# Altium integrated library mobinbyn_Connector.IntLib: 67 symbols
Pins are listed as number, name and electrical type; pins without a type are passive.

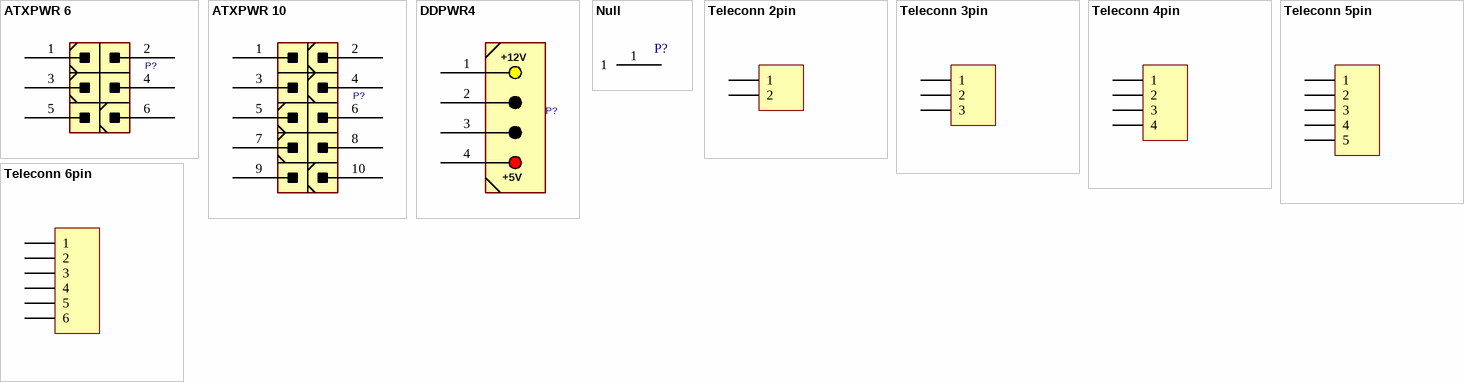
[diagram p0: symbols ATXPWR 6 to Teleconn 6pin]

## ATXPWR 6
designator P?
CONN, ATX POWER, 6 P; DatasheetVersion: 2022
footprint ATX_PWR6R (PCI Express POWER CONNECTOR 6PIN 12V Right Angle)
footprint ATX_PWR6 (Connector; ATX Power; 6 Position)
pins: 1, 2, 3, 4, 5, 6

## ATXPWR 10
designator P?
CONN, ATX POWER, 10 P; DatasheetVersion: 2022
footprint ATX_PWR10 (Connector; ATX Power; 10 Position, TE 4-1775099-3)
pins: 1, 2, 3, 4, 5, 6, 7, 8, 9, 10

## DDPWR4
designator P?
CONN, DP04PR IDE DISK DRIVE 4pin; DatasheetVersion: 2022
footprint DDPWR4_S (DP04PR IDE DISK DRIVE 4pin power connector Straight Power Plug)
footprint DDPWR4_R (DP04PR IDE DISK DRIVE 4pin power connector Right Angle Power Plug)
pins: 1, 2, 3, 4
text: +12V; +5V

## Null
designator P?
DatasheetVersion: 2022
footprint Socket
pins: 1

## Teleconn 2pin
designator P?
Telecommunications; DatasheetVersion: 2022
footprint Teleconn_2pin
pins: 1, 2

## Teleconn 3pin
designator P?
Telecommunications; DatasheetVersion: 2022
footprint Teleconn_3pin
pins: 1, 2, 3

## Teleconn 4pin
designator P?
Telecommunications; DatasheetVersion: 2022
footprint Teleconn_4pin
pins: 1, 2, 3, 4

## Teleconn 5pin
designator P?
Telecommunications; DatasheetVersion: 2022
footprint Teleconn_5pin
pins: 1, 2, 3, 4, 5

## Teleconn 6pin
designator P?
Telecommunications; DatasheetVersion: 2022
footprint Teleconn_6pin
pins: 1, 2, 3, 4, 5, 6


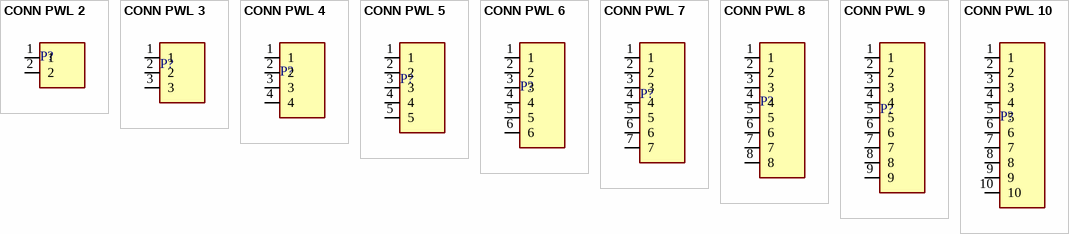
[diagram p1: symbols CONN PWL 2 to CONN PWL 10]

## CONN PWL 2
designator P?
Power Terminal 2pin,Header, 2-Pin; DatasheetVersion: 2022
footprint PWL_2 (Connector; Header; 2 Position)
pins: 1, 2

## CONN PWL 3
designator P?
Power Terminal 3pin,Header, 3-Pin; DatasheetVersion: 2022
footprint PWL_3 (Connector; Header; 3 Position)
pins: 1, 2, 3

## CONN PWL 4
designator P?
Power Terminal 4pin,Header, 4-Pin; DatasheetVersion: 2022
footprint PWL_4 (Connector; Header; 4 Position)
pins: 1, 2, 3, 4

## CONN PWL 5
designator P?
Power Terminal 5pin,Header, 5-Pin; DatasheetVersion: 2022
footprint PWL_5 (Connector; Header; 5 Position)
pins: 1, 2, 3, 4, 5

## CONN PWL 6
designator P?
Power Terminal 6pin,Header, 6-Pin; DatasheetVersion: 2022
footprint PWL_6 (Connector; Header; 6 Position)
pins: 1, 2, 3, 4, 5, 6

## CONN PWL 7
designator P?
Power Terminal 7pin,Header, 7-Pin; DatasheetVersion: 2022
footprint PWL_7 (Connector; Header; 7 Position)
pins: 1, 2, 3, 4, 5, 6, 7

## CONN PWL 8
designator P?
Power Terminal 8pin,Header, 8-Pin; DatasheetVersion: 2022
footprint PWL_8 (Connector; Header; 8 Position)
pins: 1, 2, 3, 4, 5, 6, 7, 8

## CONN PWL 9
designator P?
Power Terminal 9pin,Header, 9-Pin; DatasheetVersion: 2022
footprint PWL_9 (Connector; Header; 9 Position)
pins: 1, 2, 3, 4, 5, 6, 7, 8, 9

## CONN PWL 10
designator P?
Power Terminal 10pin,Header, 10-Pin; DatasheetVersion: 2022
footprint PWL_10 (Connector; Header; 10 Position)
pins: 1, 2, 3, 4, 5, 6, 7, 8, 9, 10


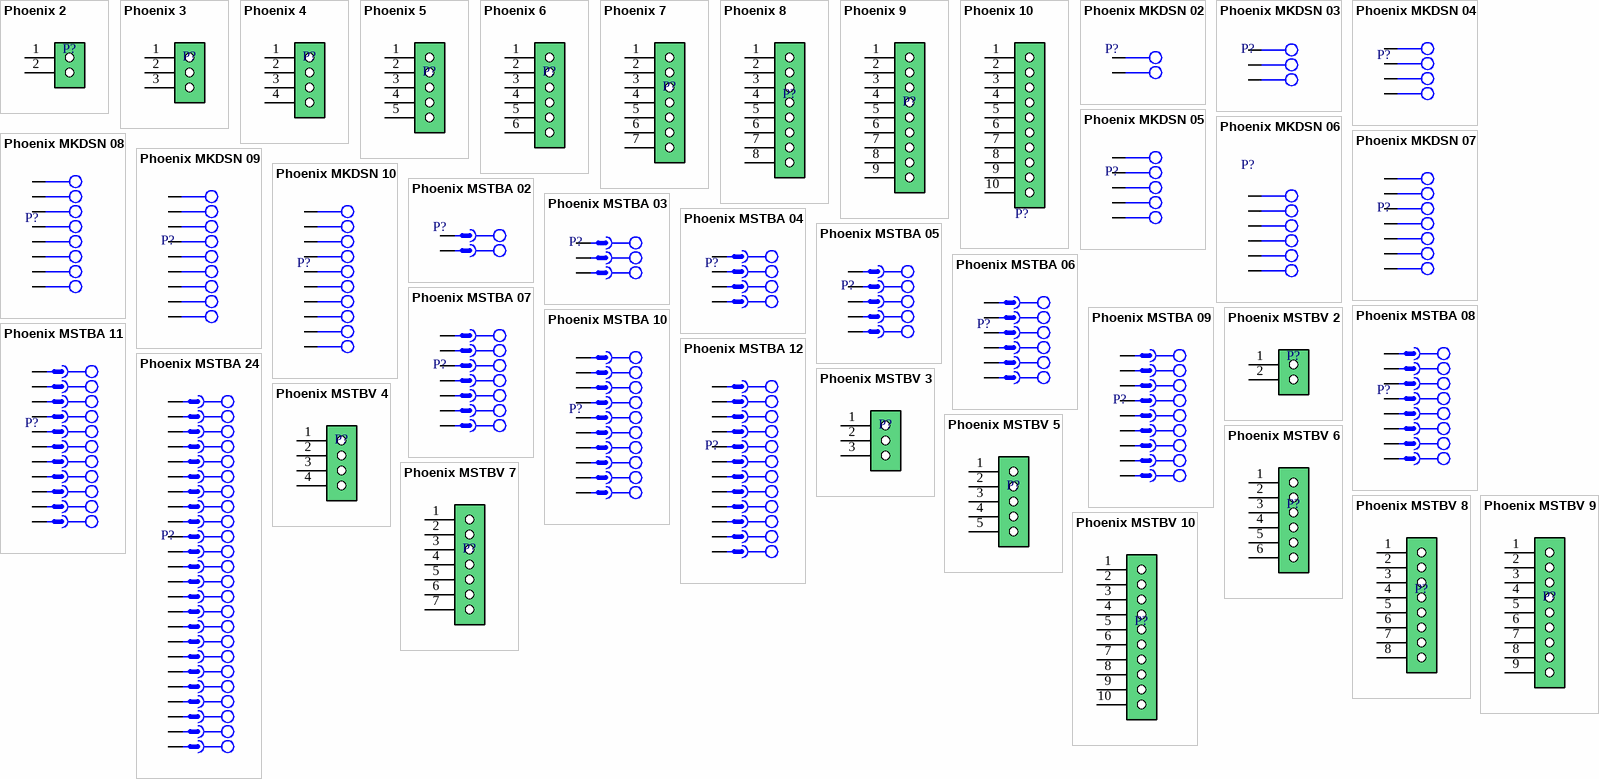
[diagram p2: symbols Phoenix 2 to Phoenix MSTBV 10]

## Phoenix 2
designator P?
ComponentLinkp-URL: https://www.smartw.ir/; DatasheetVersion: 2022
footprint PRKR2A
pins: 1, 2

## Phoenix 3
designator P?
ComponentLinkp-URL: https://www.smartw.ir/; DatasheetVersion: 2022
footprint PRKR3A
pins: 1, 2, 3

## Phoenix 4
designator P?
ComponentLinkp-URL: https://www.smartw.ir/; DatasheetVersion: 2022
footprint PRKR4A
pins: 1, 2, 3, 4

## Phoenix 5
designator P?
ComponentLinkp-URL: https://www.smartw.ir/; DatasheetVersion: 2022
footprint PRKR5A
pins: 1, 2, 3, 4, 5

## Phoenix 6
designator P?
ComponentLinkp-URL: ComponentLinkp-URL https://www.smartw.ir/; DatasheetVersion: 2022
footprint PRKR6A
pins: 1, 2, 3, 4, 5, 6

## Phoenix 7
designator P?
ComponentLinkp-URL: https://www.smartw.ir/; DatasheetVersion: 2022
footprint PRKR7A
pins: 1, 2, 3, 4, 5, 6, 7

## Phoenix 8
designator P?
ComponentLinkp-URL: https://www.smartw.ir/; DatasheetVersion: 2022
footprint PRKR8A
pins: 1, 2, 3, 4, 5, 6, 7, 8

## Phoenix 9
designator P?
ComponentLinkp-URL: https://www.smartw.ir/; DatasheetVersion: 2022
footprint PRKR9A
pins: 1, 2, 3, 4, 5, 6, 7, 8, 9

## Phoenix 10
designator P?
ComponentLinkp-URL: https://www.smartw.ir/; DatasheetVersion: 2022
footprint PRKR10A
pins: 1, 2, 3, 4, 5, 6, 7, 8, 9, 10

## Phoenix MKDSN 02
designator P?
DatasheetVersion: 2022
footprint CON_MKDSN1,5/2-5,08
pins: 1, 2

## Phoenix MKDSN 03
designator P?
DatasheetVersion: 2022
footprint CON_MKDSN1,5/3-5,08
pins: 1, 2, 3

## Phoenix MKDSN 04
designator P?
DatasheetVersion: 2022
footprint CON_MKDSN1,5/4-5,08
pins: 1, 2, 3, 4

## Phoenix MKDSN 05
designator P?
DatasheetVersion: 2022
footprint CON_MKDSN1,5/5-5,08
pins: 1, 2, 3, 4, 5

## Phoenix MKDSN 06
designator P?
DatasheetVersion: 2022
footprint CON_MKDSN1,5/6-5,08
pins: 1, 2, 3, 4, 5, 6

## Phoenix MKDSN 07
designator P?
DatasheetVersion: 2022
footprint CON_MKDSN1,5/7-5,08
pins: 1, 2, 3, 4, 5, 6, 7

## Phoenix MKDSN 08
designator P?
DatasheetVersion: 2022
footprint CON_MKDSN1,5/8-5,08
pins: 1, 2, 3, 4, 5, 6, 7, 8

## Phoenix MKDSN 09
designator P?
DatasheetVersion: 2022
footprint CON_MKDSN1,5/9-5,08
pins: 1, 2, 3, 4, 5, 6, 7, 8, 9

## Phoenix MKDSN 10
designator P?
DatasheetVersion: 2022
footprint CON_MKDSN1,5/10-5,08
pins: 1, 2, 3, 4, 5, 6, 7, 8, 9, 10

## Phoenix MSTBA 02
designator P?
DatasheetVersion: 2022
footprint CON_MSTBA02
pins: 1, 2

## Phoenix MSTBA 03
designator P?
DatasheetVersion: 2022
footprint CON_MSTBA03
pins: 1, 2, 3

## Phoenix MSTBA 04
designator P?
DatasheetVersion: 2022
footprint CON_MSTBA04
pins: 1, 2, 3, 4

## Phoenix MSTBA 05
designator P?
DatasheetVersion: 2022
footprint CON_MSTBA05
pins: 1, 2, 3, 4, 5

## Phoenix MSTBA 06
designator P?
DatasheetVersion: 2022
footprint CON_MSTBA06
pins: 1, 2, 3, 4, 5, 6

## Phoenix MSTBA 07
designator P?
DatasheetVersion: 2022
footprint CON_MSTBA07
pins: 1, 2, 3, 4, 5, 6, 7

## Phoenix MSTBA 08
designator P?
DatasheetVersion: 2022
footprint CON_MSTBA08
pins: 1, 2, 3, 4, 5, 6, 7, 8

## Phoenix MSTBA 09
designator P?
DatasheetVersion: 2022
footprint CON_MSTBA09
pins: 1, 2, 3, 4, 5, 6, 7, 8, 9

## Phoenix MSTBA 10
designator P?
DatasheetVersion: 2022
footprint CON_MSTBA10
pins: 1, 2, 3, 4, 5, 6, 7, 8, 9, 10

## Phoenix MSTBA 11
designator P?
DatasheetVersion: 2022
footprint CON_MSTBA11
pins: 1, 2, 3, 4, 5, 6, 7, 8, 9, 10, 11

## Phoenix MSTBA 12
designator P?
DatasheetVersion: 2022
footprint CON_MSTBA12
pins: 1, 2, 3, 4, 5, 6, 7, 8, 9, 10, 11, 12

## Phoenix MSTBA 24
designator P?
DatasheetVersion: 2022
footprint CON_MSTBA24
pins: 1, 2, 3, 4, 5, 6, 7, 8, 9, 10, 11, 12, 13, 14, 15, 16, 17, 18, 19, 20, 21, 22, 23, 24

## Phoenix MSTBV 2
designator P?
ComponentLinkp-URL: https://www.smartw.ir/; DatasheetVersion: 2022
footprint Phoenix MSTBV 2 (Header, Nominal current: 12 A Rated voltage (III/2): 320 V Number of positions: 2 Pitch: 5mm Color: green Contact surface: Tin Assembly: Soldering)
pins: 1, 2

## Phoenix MSTBV 3
designator P?
ComponentLinkp-URL: https://www.smartw.ir/; DatasheetVersion: 2022
footprint Phoenix MSTBV 3 (Header, Nominal current: 12 A Rated voltage (III/2): 320 V Number of positions: 3 Pitch: 5mm Color: green Contact surface: Tin Assembly: Soldering)
pins: 1, 2, 3

## Phoenix MSTBV 4
designator P?
ComponentLinkp-URL: https://www.smartw.ir/; DatasheetVersion: 2022
footprint Phoenix MSTBV 4 (Header, Nominal current: 12 A Rated voltage (III/2): 320 V Number of positions: 4 Pitch: 5mm Color: green Contact surface: Tin Assembly: Soldering)
pins: 1, 2, 3, 4

## Phoenix MSTBV 5
designator P?
ComponentLinkp-URL: https://www.smartw.ir/; DatasheetVersion: 2022
footprint Phoenix MSTBV 5 (Header, Nominal current: 12 A Rated voltage (III/2): 320 V Number of positions: 5 Pitch: 5mm Color: green Contact surface: Tin Assembly: Soldering)
pins: 1, 2, 3, 4, 5

## Phoenix MSTBV 6
designator P?
ComponentLinkp-URL: https://www.smartw.ir/; DatasheetVersion: 2022
footprint Phoenix MSTBV 6 (Header, Nominal current: 12 A Rated voltage (III/2): 320 V Number of positions: 6 Pitch: 5mm Color: green Contact surface: Tin Assembly: Soldering)
pins: 1, 2, 3, 4, 5, 6

## Phoenix MSTBV 7
designator P?
ComponentLinkp-URL: https://www.smartw.ir/; DatasheetVersion: 2022
footprint Phoenix MSTBV 7 (Header, Nominal current: 12 A Rated voltage (III/2): 320 V Number of positions: 6 Pitch: 5mm Color: green Contact surface: Tin Assembly: Soldering)
pins: 1, 2, 3, 4, 5, 6, 7

## Phoenix MSTBV 8
designator P?
ComponentLinkp-URL: https://www.smartw.ir/; DatasheetVersion: 2022
footprint Phoenix MSTBV 8 (Header, Nominal current: 12 A Rated voltage (III/2): 320 V Number of positions: 6 Pitch: 5mm Color: green Contact surface: Tin Assembly: Soldering)
pins: 1, 2, 3, 4, 5, 6, 7, 8

## Phoenix MSTBV 9
designator P?
ComponentLinkp-URL: https://www.smartw.ir/; DatasheetVersion: 2022
footprint Phoenix MSTBV 9 (Header, Nominal current: 12 A Rated voltage (III/2): 320 V Number of positions: 6 Pitch: 5mm Color: green Contact surface: Tin Assembly: Soldering)
pins: 1, 2, 3, 4, 5, 6, 7, 8, 9

## Phoenix MSTBV 10
designator P?
ComponentLinkp-URL: https://www.smartw.ir/; DatasheetVersion: 2022
footprint Phoenix MSTBV 10 (Header, Nominal current: 12 A Rated voltage (III/2): 320 V Number of positions: 6 Pitch: 5mm Color: green Contact surface: Tin Assembly: Soldering)
pins: 1, 2, 3, 4, 5, 6, 7, 8, 9, 10


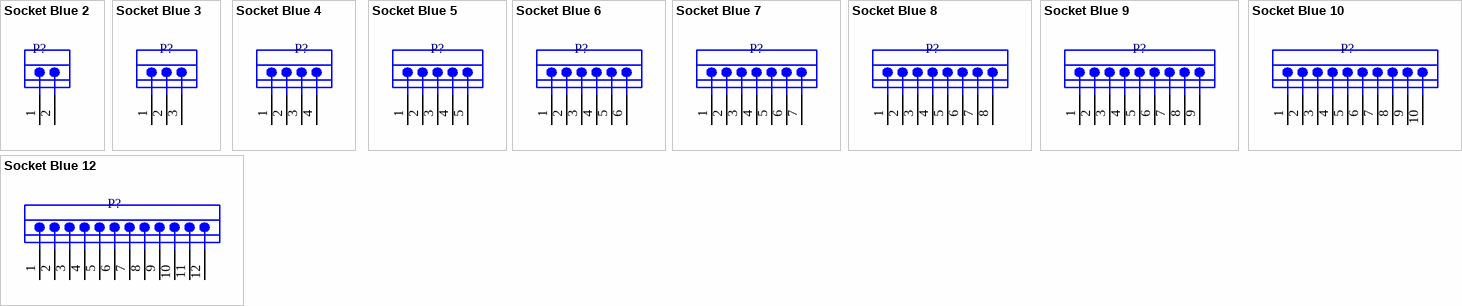
[diagram p3: symbols Socket Blue 2 to Socket Blue 12]

## Socket Blue 2
designator P?
DatasheetVersion: 2022
footprint Socket Blue 2
pins: 1, 2

## Socket Blue 3
designator P?
DatasheetVersion: 2022
footprint Socket Blue 3
pins: 1, 2, 3

## Socket Blue 4
designator P?
DatasheetVersion: 2022
footprint Socket Blue 4
pins: 1, 2, 3, 4

## Socket Blue 5
designator P?
DatasheetVersion: 2022
footprint Socket Blue 5
pins: 1, 2, 3, 4, 5

## Socket Blue 6
designator P?
DatasheetVersion: 2022
footprint socket blue 6
pins: 1, 2, 3, 4, 5, 6

## Socket Blue 7
designator P?
DatasheetVersion: 2022
footprint Socket Blue 7
pins: 1, 2, 3, 4, 5, 6, 7

## Socket Blue 8
designator P?
DatasheetVersion: 2022
footprint Socket Blue 8
pins: 1, 2, 3, 4, 5, 6, 7, 8

## Socket Blue 9
designator P?
DatasheetVersion: 2022
footprint Socket Blue 9
pins: 1, 2, 3, 4, 5, 6, 7, 8, 9

## Socket Blue 10
designator P?
DatasheetVersion: 2022
footprint Socket Blue 10
pins: 1, 2, 3, 4, 5, 6, 7, 8, 9, 10

## Socket Blue 12
designator P?
DatasheetVersion: 2022
footprint Socket Blue 12
pins: 1, 2, 3, 4, 5, 6, 7, 8, 9, 10, 11, 12